# Altium footprint library NDLib.PCBLIB: 499 footprints (part 19 of 32)
Each footprint in its own frame and in the unit in brackets; x right, y up, seen from the top. Pads: shape width x height; smd on the part's side, far side on the other; paste and mask are expansions set on the pad; w line width, h text height; cw(c..) or ccw(c..) is an arc to the next point about the centre after c.
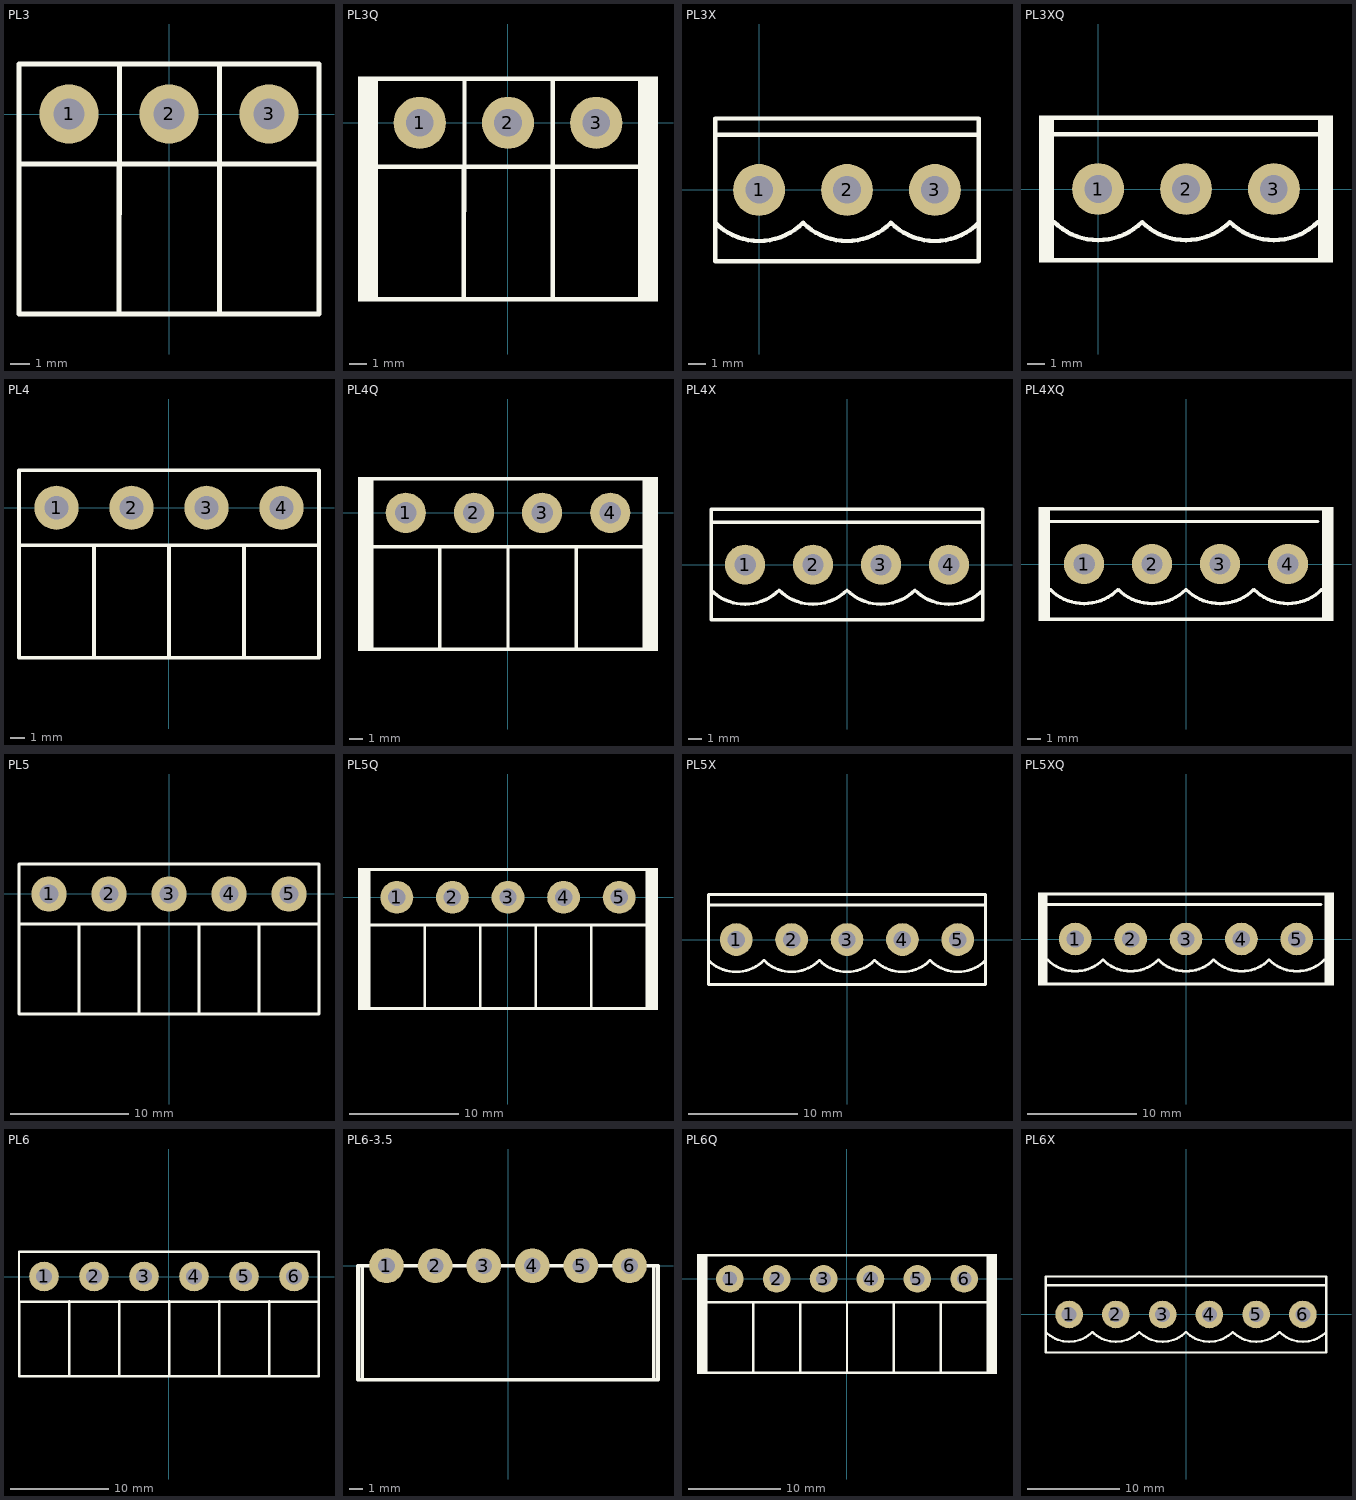
[diagram p18: the footprints below, top view; thin cyan lines are the x and y axes]

## PL3 [mm]
pads (3):
  round 3 hole 1.6: 1(-5.08,0) 2(0,0) 3(5.08,0)
TopOverlay:
  lines w0.254: -2.54,2.54 7.62,2.54 7.62,-10.16 -2.54,-10.16 -2.54,-2.54 7.62,-2.54 ; -2.507,-5.08 -2.507,2.54 ; 2.573,-5.08 2.573,2.54 -7.62,2.54 -7.62,-10.16 ; -7.62,-10.16 -7.62,-2.54 2.573,-2.54 2.573,-10.16 -7.62,-10.16

## PL3Q [mm]
pads (3):
  round 3 hole 1.6: 1(-5.08,0) 2(0,0) 3(5.08,0)
TopOverlay:
  rectangle: 7.671,-10.287 8.636,2.667
  region: -7.671,2.667 -8.636,2.667 -8.636,-10.287 -7.671,-10.287
  lines w0.254: -2.54,2.54 7.62,2.54 7.62,-10.16 -2.54,-10.16 -2.54,-2.54 7.62,-2.54 ; -2.507,-5.08 -2.507,2.54 ; 2.573,-5.08 2.573,2.54 -7.62,2.54 -7.62,-10.16 ; -7.62,-10.16 2.573,-10.16 2.573,-2.54 -7.62,-2.54 -7.62,-10.16

## PL3X [mm]
pads (3):
  round 3 hole 1.6: 1(0,0) 2(5.08,0) 3(10.16,0)
TopOverlay:
  lines w0.254: -2.54,-1.905 ccw(c0,0.635) 2.54,-1.905 ccw(c5.08,0.635) 7.62,-1.905 ccw(c10.16,0.635) 12.7,-1.905 ; -2.54,3.175 7.62,3.175 12.383,3.175 12.7,3.175 ; -2.54,-4.127 -2.54,4.127 7.62,4.127 12.7,4.127 12.7,-4.127 7.62,-4.127 -2.54,-4.127

## PL3XQ [mm]
pads (3):
  round 3 hole 1.6: 1(0,0) 2(5.08,0) 3(10.16,0)
TopOverlay:
  region: -2.54,4.255 -3.41,4.255 -3.41,-4.255 -2.54,-4.255
  rectangle: 12.7,-4.255 13.57,4.255
  lines w0.254: -2.54,-4.127 7.62,-4.127 12.7,-4.127 ; -2.54,-1.905 ccw(c0,0.635) 2.54,-1.905 ccw(c5.08,0.635) 7.62,-1.905 ccw(c10.16,0.635) 12.7,-1.905 ; -2.54,3.175 7.62,3.175 13.335,3.175 ; -2.54,4.127 7.62,4.127 12.7,4.127

## PL4 [mm]
pads (4):
  round 3 hole 1.6: 1(-7.62,0) 2(-2.54,0) 3(2.54,0) 4(7.62,0)
TopOverlay:
  lines w0.254: -5.08,-10.16 -5.08,-2.54 ; 0,-10.16 0,-2.54 ; 5.08,-10.16 5.08,-2.54 ; -10.16,-10.16 -10.16,-2.54 10.16,-2.54 ; -10.16,-10.16 -10.16,2.54 10.16,2.54 10.16,-2.54 ; -10.16,-10.16 10.16,-10.16 ; 10.16,-10.16 10.16,-2.54 ; 10.16,-10.16 10.16,-2.54

## PL4Q [mm]
pads (4):
  round 3 hole 1.6: 1(-7.62,0) 2(-2.54,0) 3(2.54,0) 4(7.62,0)
TopOverlay:
  region: -10.211,2.667 -11.176,2.667 -11.176,-10.287 -10.211,-10.287
  rectangle: 10.211,-10.287 11.176,2.667
  lines w0.254: -5.08,-10.16 -5.08,-2.54 ; 0,-10.16 0,-2.54 ; 5.08,-10.16 5.08,-2.54 ; -10.16,-10.16 -10.16,-2.54 10.16,-2.54 ; -10.16,-10.16 -10.16,2.54 10.16,2.54 10.16,-2.54 ; -10.16,-10.16 10.16,-10.16 ; 10.16,-10.16 10.16,-2.54 ; 10.16,-10.16 10.16,-2.54

## PL4X [mm]
pads (4):
  round 3 hole 1.6: 1(-7.62,0) 2(-2.54,0) 3(2.54,0) 4(7.62,0)
TopOverlay:
  lines w0.254: -10.16,-1.905 ccw(c-7.62,0.635) -5.08,-1.905 ccw(c-2.54,0.635) 0,-1.905 ccw(c2.54,0.635) 5.08,-1.905 ccw(c7.62,0.635) 10.16,-1.905 ; -10.16,3.175 0,3.175 4.763,3.175 ; 10.16,3.175 9.842,3.175 5.08,3.175 ; 4.763,3.175 5.08,3.175 ; 4.763,3.175 5.08,3.175 ; 4.763,3.175 5.08,3.175 ; 4.763,3.175 5.08,3.175 ; -10.16,-4.127 0,-4.127 5.08,-4.127 10.16,-4.127 10.16,4.127 5.08,4.127 0,4.127 -10.16,4.127 -10.16,-4.127

## PL4XQ [mm]
pads (4):
  round 3 hole 1.6: 1(-7.62,0) 2(-2.54,0) 3(2.54,0) 4(7.62,0)
TopOverlay:
  rectangle: 10.16,-4.255 11.03,4.255
  region: -10.16,4.255 -11.03,4.255 -11.03,-4.255 -10.16,-4.255
  lines w0.254: -10.16,-4.127 0,-4.127 5.08,-4.127 10.16,-4.127 ; -10.16,-1.905 ccw(c-7.62,0.635) -5.08,-1.905 ccw(c-2.54,0.635) 0,-1.905 ccw(c2.54,0.635) 5.08,-1.905 ccw(c7.62,0.635) 10.16,-1.905 ; -10.16,3.175 0,3.175 4.763,3.175 ; -10.16,4.127 0,4.127 5.08,4.127 10.16,4.127 ; 9.842,3.175 5.08,3.175 ; 4.763,3.175 5.08,3.175 ; 4.763,3.175 5.08,3.175 ; 4.763,3.175 5.08,3.175 ; 4.763,3.175 5.08,3.175

## PL5 [mm]
pads (5):
  round 3 hole 1.6: 1(-10.16,0) 2(-5.08,0) 3(0,0) 4(5.08,0) 5(10.16,0)
TopOverlay:
  lines w0.254: -7.62,-10.16 -7.62,-2.54 ; -2.54,-10.16 -2.54,-2.54 ; 2.54,2.54 12.7,2.54 12.7,-2.54 ; 2.558,2.54 -12.7,2.54 -12.7,-10.16 ; 7.62,-10.16 7.62,-2.54 ; -12.7,-10.16 2.54,-10.16 ; -12.7,-10.16 -12.7,-2.54 2.54,-2.54 ; 2.54,-10.16 12.7,-10.16 12.7,-2.54 ; 2.54,-10.16 2.54,-2.54 ; 2.54,-10.16 2.54,-2.54 ; 2.54,-10.16 2.54,-2.54 ; 2.54,-2.54 12.7,-2.54

## PL5Q [mm]
pads (5):
  round 3 hole 1.6: 1(-10.16,0) 2(-5.08,0) 3(0,0) 4(5.08,0) 5(10.16,0)
TopOverlay:
  region: -12.751,2.667 -13.716,2.667 -13.716,-10.287 -12.751,-10.287
  rectangle: 12.751,-10.287 13.716,2.667
  lines w0.254: -7.62,-10.16 -7.62,-2.54 ; -2.54,-10.16 -2.54,-2.54 ; 2.54,2.54 12.7,2.54 12.7,-2.54 ; 2.558,2.54 -12.7,2.54 -12.7,-10.16 ; 7.62,-10.16 7.62,-2.54 ; -12.7,-10.16 -12.7,-2.54 2.54,-2.54 ; -12.7,-10.16 2.54,-10.16 ; 2.54,-10.16 2.54,-2.54 ; 2.54,-10.16 2.54,-2.54 ; 2.54,-10.16 2.54,-2.54 ; 2.54,-10.16 12.7,-10.16 12.7,-2.54 ; 2.54,-2.54 12.7,-2.54

## PL5X [mm]
pads (5):
  round 3 hole 1.6: 1(-10.16,0) 2(-5.08,0) 3(0,0) 4(5.08,0) 5(10.16,0)
TopOverlay:
  lines w0.254: -12.7,-1.905 ccw(c-10.16,0.635) -7.62,-1.905 ccw(c-5.08,0.635) -2.54,-1.905 ccw(c0,0.635) 2.54,-1.905 ccw(c5.08,0.635) 7.62,-1.905 ccw(c10.16,0.635) 12.7,-1.905 ; -12.7,3.175 -2.54,3.175 2.222,3.175 2.54,3.175 7.302,3.175 ; 12.7,3.175 12.383,3.175 7.62,3.175 ; 7.302,3.175 7.62,3.175 ; 7.302,3.175 7.62,3.175 ; -12.7,-4.127 -12.7,4.127 -2.54,4.127 2.54,4.127 7.62,4.127 12.7,4.127 12.7,-4.127 7.62,-4.127 2.54,-4.127 -2.54,-4.127 -12.7,-4.127

## PL5XQ [mm]
pads (5):
  round 3 hole 1.6: 1(-10.16,0) 2(-5.08,0) 3(0,0) 4(5.08,0) 5(10.16,0)
TopOverlay:
  region: -12.7,4.255 -13.57,4.255 -13.57,-4.255 -12.7,-4.255
  rectangle: 12.7,-4.255 13.57,4.255
  lines w0.254: -12.7,-4.127 -2.54,-4.127 2.54,-4.127 7.62,-4.127 12.7,-4.127 ; -12.7,-1.905 ccw(c-10.16,0.635) -7.62,-1.905 ccw(c-5.08,0.635) -2.54,-1.905 ccw(c0,0.635) 2.54,-1.905 ccw(c5.08,0.635) 7.62,-1.905 ccw(c10.16,0.635) 12.7,-1.905 ; -12.7,3.175 -2.54,3.175 2.222,3.175 2.54,3.175 7.302,3.175 ; -12.7,4.127 -2.54,4.127 2.54,4.127 7.62,4.127 12.7,4.127 ; 12.383,3.175 7.62,3.175 ; 7.302,3.175 7.62,3.175 ; 7.302,3.175 7.62,3.175

## PL6 [mm]
pads (6):
  round 3 hole 1.6: 1(-12.7,0) 2(-7.62,0) 3(-2.54,0) 4(2.54,0) 5(7.62,0) 6(12.7,0)
TopOverlay:
  lines w0.254: -10.16,-10.16 -10.16,-2.54 ; -5.08,-10.16 -5.08,-2.54 ; 0,-10.16 0,-2.54 ; 5.08,-10.16 5.08,-2.54 ; 10.16,-10.16 10.16,-2.54 ; 15.24,-2.54 -15.24,-2.54 -15.24,-10.16 ; -15.24,-10.16 15.24,-10.16 15.24,2.54 -15.24,2.54 -15.24,-10.16

## PL6-3.5 [mm]
pads (6):
  round 2.5 hole 1.2: 1(-8.75,0) 2(-5.25,0) 3(-1.75,0) 4(1.75,0) 5(5.25,0) 6(8.75,0)
TopOverlay:
  lines w0.254: -10.5,-8.2 -10.8,-8.2 -10.8,0 -10.5,0 ; -10.5,-8.2 -10.5,0 ; -10.5,-8.2 10.5,-8.2 ; -10.5,0 10.5,0 ; 10.5,-8.2 10.8,-8.2 10.8,0 10.5,0 ; 10.5,-8.2 10.5,0

## PL6Q [mm]
pads (6):
  round 3 hole 1.6: 1(-12.7,0) 2(-7.62,0) 3(-2.54,0) 4(2.54,0) 5(7.62,0) 6(12.7,0)
TopOverlay:
  rectangle: 15.291,-10.287 16.256,2.667
  region: -15.291,2.667 -16.256,2.667 -16.256,-10.287 -15.291,-10.287
  lines w0.254: -10.16,-10.16 -10.16,-2.54 ; -5.08,-10.16 -5.08,-2.54 ; 0,-10.16 0,-2.54 ; 5.08,-10.16 5.08,-2.54 ; 10.16,-10.16 10.16,-2.54 ; 15.24,-2.54 -15.24,-2.54 -15.24,-10.16 ; -15.24,-10.16 15.24,-10.16 15.24,2.54 -15.24,2.54 -15.24,-10.16

## PL6X [mm]
pads (6):
  round 3 hole 1.6: 1(-12.7,0) 2(-7.62,0) 3(-2.54,0) 4(2.54,0) 5(7.62,0) 6(12.7,0)
TopOverlay:
  lines w0.254: -15.24,-1.905 ccw(c-12.7,0.635) -10.16,-1.905 ccw(c-7.62,0.635) -5.08,-1.905 ccw(c-2.54,0.635) 0,-1.905 ccw(c2.54,0.635) 5.08,-1.905 ccw(c7.62,0.635) 10.16,-1.905 ccw(c12.7,0.635) 15.24,-1.905 ; -15.24,3.175 -5.08,3.175 -0.318,3.175 0,3.175 4.763,3.175 ; 15.24,3.175 14.922,3.175 10.16,3.175 ; 4.763,3.175 5.08,3.175 ; 4.763,3.175 5.08,3.175 ; 5.08,3.175 9.842,3.175 ; 9.842,3.175 10.16,3.175 ; 9.842,3.175 10.16,3.175 ; 9.842,3.175 10.16,3.175 ; -15.24,-4.127 -5.08,-4.127 0,-4.127 5.08,-4.127 10.16,-4.127 15.24,-4.127 15.24,4.127 10.16,4.127 5.08,4.127 0,4.127 -5.08,4.127 -15.24,4.127 -15.24,-4.127